# Altium footprint library 集大电协1.5.PcbLib: 227 footprints (part 11 of 18)
Each footprint in its own frame and in the unit in brackets; x right, y up, seen from the top. Pads: shape width x height; smd on the part's side, far side on the other; paste and mask are expansions set on the pad; w line width, h text height; cw(c..) or ccw(c..) is an arc to the next point about the centre after c.
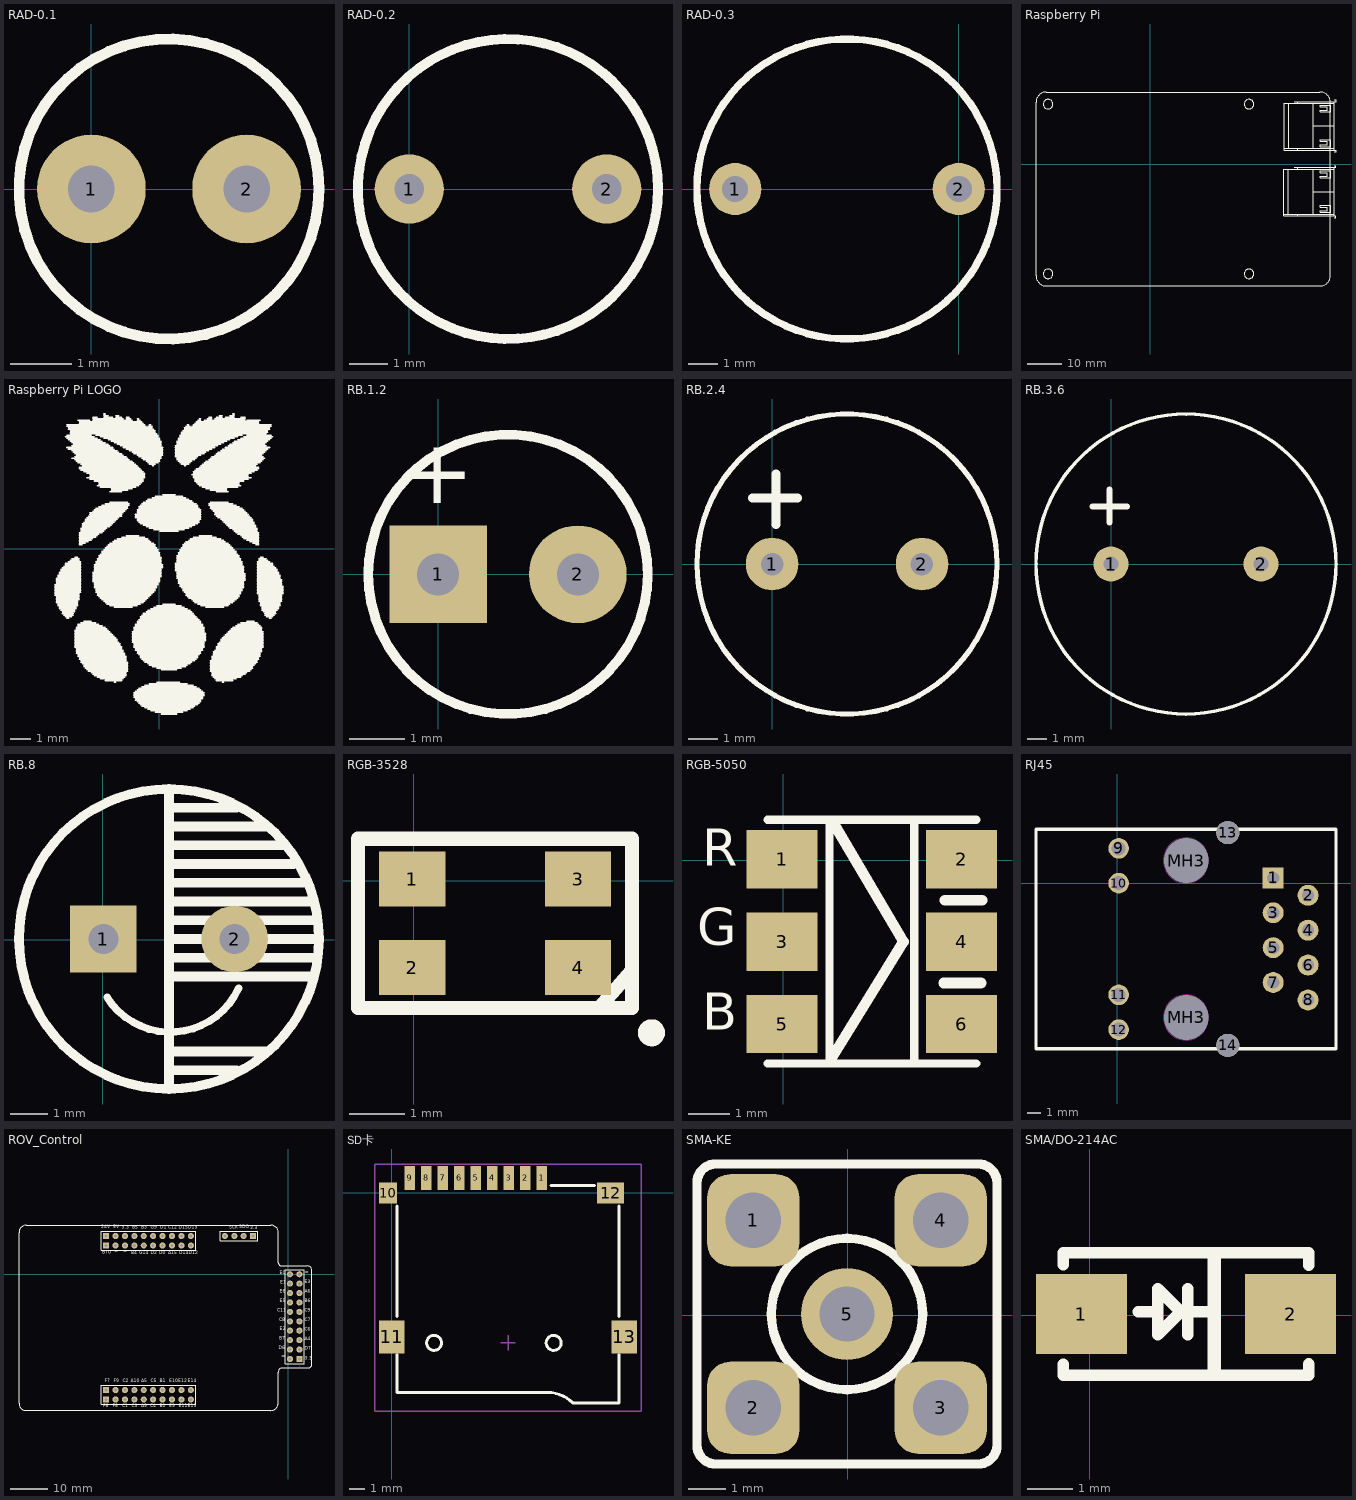
[diagram p10: the footprints below, top view; thin cyan lines are the x and y axes]

## RAD-0.1 [mil]
pads (2):
  round 70 hole 30: 1(0,0) 2(100,0)
Top Overlay:
  circle w7: c50,0 r96.65

## RAD-0.2 [mil]
pads (2):
  round 70 hole 30: 1(0,0) 2(200,0)
Top Overlay:
  circle w10: c100,0 r151.92
3D body: height 472.44, standoff -98.43, extent -96.56,-197.84 296.57,195.86

## RAD-0.3 [mil]
pads (2):
  round 70 hole 35: 1(-300,0) 2(0,0)
Top Overlay:
  circle w10: c-150,0 r201.21
3D body: height 1000, standoff -1131.89, extent -417,-243.84 102.01,275.84

## Raspberry Pi [mm]
Top Overlay:
  circle w0.254: c28.556,17.281 r1.375
  circle w0.254: c-29.444,-31.719 r1.375
  circle w0.254: c-29.444,17.281 r1.375
  circle w0.254: c28.556,-31.719 r1.375
  lines w0.1: 38.606,-14.465 42.606,-14.465 ; 38.681,4.535 42.681,4.535 ; 39.906,-14.465 39.906,-1.465 ; 39.981,4.535 39.981,17.535 ; 41.606,-0.965 53.106,-0.965 ; 41.681,18.035 53.181,18.035 ; 42.606,-14.965 42.606,-14.465 ; 42.606,-0.965 42.606,-1.465 53.106,-1.465 39.906,-1.465 ; 42.681,4.035 42.681,4.535 ; 42.681,18.035 42.681,17.535 53.181,17.535 39.981,17.535 ; 47.106,-14.465 47.106,-1.465 ; 47.106,-7.965 53.106,-7.965 53.106,-0.965 ; 47.181,4.535 47.181,17.535 ; 47.181,11.035 53.181,11.035 53.181,18.035 ; 53.106,-15.465 53.606,-15.465 53.606,-14.965 53.106,-14.965 ; 53.106,-14.465 42.606,-14.465 ; 53.106,-0.465 53.606,-0.465 53.606,-0.965 53.106,-0.965 ; 53.181,3.535 53.681,3.535 53.681,4.035 53.181,4.035 ; 53.181,4.535 42.681,4.535 ; 53.181,18.535 53.681,18.535 53.681,18.035 53.181,18.035 ; 39.906,-1.465 38.606,-1.465 38.606,-7.965 38.606,-14.965 53.106,-14.965 ; 39.981,17.535 38.681,17.535 38.681,11.035 38.681,4.035 53.181,4.035 ; 53.106,-14.965 53.106,-0.965 ; 53.181,4.035 53.181,18.035 ; 49.106,-13.965 52.106,-13.965 52.106,-13.465 52.106,-11.965 49.106,-11.965 49.106,-12.465 51.106,-12.465 51.106,-13.465 49.106,-13.465 49.106,-13.965 ; 49.106,-3.965 52.106,-3.965 52.106,-3.465 52.106,-1.965 49.106,-1.965 49.106,-2.465 51.106,-2.465 51.106,-3.465 49.106,-3.465 49.106,-3.965 ; 49.181,5.035 49.181,5.535 51.181,5.535 51.181,6.535 49.181,6.535 49.181,7.035 52.181,7.035 52.181,5.535 52.181,5.035 49.181,5.035 ; 49.181,15.035 49.181,15.535 51.181,15.535 51.181,16.535 49.181,16.535 49.181,17.035 52.181,17.035 52.181,15.535 52.181,15.035 49.181,15.035
  lines w0.254: -32.944,-32.219 ccw(c-29.944,-32.219) -29.944,-35.219 49.056,-35.219 ccw(c49.056,-32.219) 52.056,-32.219 52.056,17.781 ccw(c49.056,17.781) 49.056,20.781 -29.944,20.781 ccw(c-29.944,17.781) -32.944,17.781 -32.944,-32.219

## Raspberry Pi LOGO [mm]
Top Overlay:
  drawing of 575 lines, arcs and shapes, not listed

## RB.1.2 [mil]
pads (2):
  rect 70x70 hole 30: 1(0,0)
  round 70 hole 30: 2(100,0)
Top Overlay:
  circle w7: c50,0 r100
  text "+" at 26,36 h78.74
3D body "CAP_4X7.STEP": height 277.8, standoff -667.09, extent -27.56,-72.83 129.92,84.65

## RB.2.4 [mil]
pads (2):
  round 70 hole 30: 1(0,0) 2(200,0)
Top Overlay:
  circle w7: c100,0 r200
  lines w12: -26,88 34,88 ; 5,53 5,120
3D body "CAP 10.STEP": height 511.81, standoff -543.31, extent -109.65,-218.35 315.94,206.54

## RB.3.6 [mil]
pads (2):
  round 70 hole 30: 1(0,0) 2(300,0)
Top Overlay:
  circle w7: c150,0 r300
  lines w12: -37,115 32,115 ; -3,83 -3,149
3D body "Capacitor Radial Electrolitic.step": height 1575.2, standoff -106.3, extent -203.73,-352.35 504.23,356.3

## RB.8 [mil]
pads (2):
  rect 70x70 / inner round 70 / far side round 70 hole 31.5: 1(0.6,0.53)
  round 70 hole 31.5: 2(138.39,0.53)
Top Overlay:
  circle w10: c69.5,0.53 r157.48
  lines w7.87: 4.48,-60.81 ccw(c70.87,-18.49) 142.48,-51.23
  lines w10: 69.5,-153.02 69.5,154.07 ; 69.5,-137.27 140.44,-137.27 ; 69.5,-117.58 170.44,-117.58 ; 69.5,-38.84 220.44,-38.84 ; 69.5,-19.16 220.44,-19.16 ; 69.5,0.53 226.98,0.53 ; 69.5,20.21 220.44,20.21 ; 69.5,39.9 220.44,39.9 ; 69.5,59.58 210.44,59.58 ; 69.5,79.27 200.44,79.27 ; 69.5,98.95 190.44,98.95 ; 69.5,118.64 170.44,118.64 ; 69.5,138.32 140.44,138.32
3D body "SW3dPS-Cap electro 8x11.5x3.5mm.STEP": height 465.57, standoff -144.78, extent -88.98,-157.94 227.98,159.02

## RGB-3528 [mm]
pads (4):
  rect 1.2x1 smd: 1(-0.029,0.03) 2(-0.029,-1.57) 3(2.971,0.03) 4(2.971,-1.57)
Top Overlay:
  circle w0.254: c4.3,-2.75 r0.117
  lines w0.254: 3.375,-2.275 3.925,-1.65 ; -1.007,-2.301 3.949,-2.301 3.949,0.758 -1.007,0.758 -1.007,-2.301
3D body "User Library-KAA-3528.STEP": height 1.9, standoff 0, extent -0.325,-2.2 3.175,0.6

## RGB-5050 [mm]
pads (6):
  rect 1.7x1.397 smd: 1(-0.022,0.025) 2(4.278,0.025) 3(-0.022,-1.95) 4(4.278,-1.95) 5(-0.022,-3.925) 6(4.278,-3.925)
Top Overlay:
  lines w0.2: -0.372,-4.871 4.628,-4.871 ; -0.372,0.971 4.628,0.971 ; 1.112,-4.871 1.112,0.971 ; 3.144,-4.744 3.144,0.971
  lines w0.254: 1.182,-4.709 2.89,-1.95 1.239,0.844 ; 3.855,-2.94 4.744,-2.94 ; 3.88,-0.959 4.769,-0.959
  text "B" at -1.936,-4.363 h1.52
  text "G" at -2.063,-2.331 h1.52
  text "R" at -1.936,-0.426 h1.52
3D body: height 1.4, standoff -0.15, extent -0.622,-4.41 4.878,0.59

## RJ45 [mm]
pads (16):
  rect 1.524x1.524 hole 0.889: 1(11.347,0.398)
  round 1.524 hole 0.889: 2(13.887,-0.872) 3(11.347,-2.142) 4(13.887,-3.412) 5(11.347,-4.682) 6(13.887,-5.952) 7(11.347,-7.222) 8(13.887,-8.492)
  round 1.5 hole 1.02: 9(0.097,2.548) 10(0.097,0.012) 11(0.097,-8.116) 12(0.097,-10.652)
  round 1.7 hole 1.65: 13(8.045,3.698) 14(8.045,-11.802)
  round 2.95 hole 3.25: MH3(5.01,-9.768) MH3(5.01,1.662)
Top Overlay:
  lines w0.254: -5.925,-12.052 -5.925,-4.052 -5.925,3.948 15.919,3.948 15.919,-4.052 15.919,-12.052 -5.925,-12.052
Keep-Out Layer:
  circle w0.051: c4.997,-9.766 r1.65
  circle w0.051: c4.997,1.664 r1.65
Multi-Layer:
  circle w0.127: c5.01,1.662 r1.798
  circle w0.127: c5.01,-9.768 r1.798
3D body "RJ45 HanRun网口3D封装.STEP": height 14, standoff -2.5, extent -5.825,-12.075 15.575,3.805

## ROV_Control [mil] "航行器控制中心"
pads (64):
  rect 65x65 hole 34: 1(-1936.07,306.74) 20(-1936.07,407.13) 31(117.59,-898.86) 41(-1936.07,-1329.03) 60(-1936.07,-1228.64) 61(-374.2,408.2)
  round 65 hole 34: 2(-1836.07,306.74) 3(-1736.07,306.74) 4(-1636.07,306.74) 5(-1536.27,306.74) 6(-1436.27,306.74) 8(-1236.46,306.74) 10(-1036.07,306.74) 11(-1036.07,407.13) 13(-1236.46,407.13) 15(-1436.27,407.13) 16(-1536.27,407.13) 17(-1636.07,407.13) 18(-1736.07,407.13) 19(-1836.07,407.13) 21(17.2,1.14) 22(17.2,-98.86) 23(17.2,-198.86) 24(17.2,-298.86) 25(17.2,-398.66) 26(17.2,-498.66) 28(17.2,-698.46) 30(17.2,-898.86) 33(117.59,-698.46) 35(117.59,-498.66) 36(117.59,-398.66) 37(117.59,-298.86) 38(117.59,-198.86) 39(117.59,-98.86) 40(117.59,1.14) 42(-1836.07,-1329.03) 43(-1736.07,-1329.03) 44(-1636.07,-1329.03) 45(-1536.27,-1329.03) 46(-1436.27,-1329.03) 48(-1236.46,-1329.03) 50(-1036.07,-1329.03) 51(-1036.07,-1228.64) 53(-1236.46,-1228.64) 55(-1436.27,-1228.64) 56(-1536.27,-1228.64) 57(-1636.07,-1228.64) 58(-1736.07,-1228.64) 59(-1836.07,-1228.64) 62(-474.2,408.2) 63(-574.2,408.2) 64(-674.2,408.2)
  round 65 hole 34 paste+0: 7(-1336.46,306.74) 9(-1136.07,306.74) 12(-1136.07,407.13) 14(-1336.46,407.13) 27(17.2,-598.46) 29(17.2,-798.86) 32(117.59,-798.86) 34(117.59,-598.46) 47(-1336.46,-1329.03) 49(-1136.07,-1329.03) 52(-1136.07,-1228.64) 54(-1336.46,-1228.64)
Bottom Layer:
  region: 115.18,-967.46 115.18,-982.46
  region: 115.18,-967.46 115.18,-982.46
  region: 115.18,-967.46 115.18,-982.46
Top Overlay:
  lines w7.87: -1986.07,-1279.03 -1986.07,-1379.03 -984.5,-1379.03 -984.5,-1279.03 ; -1986.07,-1278.64 -1986.07,-1178.64 -984.5,-1178.64 -984.5,-1278.64 ; -1986.07,356.74 -1986.07,256.74 -984.5,256.74 -984.5,356.74 ; -1986.07,357.13 -1986.07,457.13 -984.5,457.13 -984.5,357.13 ; 67.2,-950.43 -32.8,-950.43 -32.8,51.14 67.2,51.14 ; 67.59,-950.43 167.59,-950.43 167.59,51.14 67.59,51.14 ; -724.2,358.2 -324.2,358.2 -324.2,458.2 -724.2,458.2 -724.2,358.2
  lines w10: -187.22,-1446.42 ccw(c-187.22,-1367.68) -108.48,-1367.68 ; -184.3,-1446.16 -2782.72,-1446.16 cw(c-2782.72,-1367.42) -2861.46,-1367.42 -2861.46,443.61 cw(c-2782.72,443.61) -2782.72,522.35 -184.3,522.35 cw(c-184.3,443.61) -105.56,443.61 -105.56,122.82 ccw(c-72.27,122.82) -72.27,89.54 202.75,89.54 cw(c202.75,41.1) 251.18,41.1 251.18,-949.15 cw(c205.87,-949.15) 205.87,-994.46 -58.82,-994.46 ; -108.48,-1366.69 -108.48,-1040.48 ; -108.48,-1041.46 cw(c-61.74,-1041.46) -61.74,-994.72
  text "G9" at -1463,468.89 h60
  text "G14" at -1585,197.54 h60
  text "3.3" at -1767.82,468.33 h60
  text "3.3" at 173.18,-920.46 h60
  text "-" at 175.72,-39.47 h150
  text "E2" at -90.72,-610.98 h60
  text "B7" at -96.6,-711.97 h60
  text "E0" at -91.83,-13.47 h60
  text "E1" at -84.78,-113.01 h60
  text "E3" at 175.58,-112.85 h60
  text "A6" at 175.63,-213.3 h60
  text "E6" at -91.83,-211.45 h60
  text "E5" at -90.72,-313.44 h60
  text "B6" at 175.58,-313.75 h60
  text "C11" at -117.82,-411.46 h60
  text "C9" at 175.63,-414.21 h60
  text "C8" at -98.49,-513.43 h60
  text "C7" at 175.63,-514.66 h60
  text "C6" at 175.63,-615.11 h60
  text "A4" at 175.63,-716.12 h60
  text "D7" at 175.58,-816.57 h60
  text "E14" at -1070.82,-1162.46 h60
  text "E12" at -1168.82,-1162.46 h60
  text "E10" at -1266.82,-1162.46 h60
  text "B1" at -1364.82,-1162.46 h60
  text "A5" at -1560.76,-1161.69 h60
  text "A10" at -1671.82,-1163.46 h60
  text "F9" at -1854.82,-1162.3 h60
  text "F7" at -1952.82,-1161.69 h60
  text "C2" at -1756.76,-1162.3 h60
  text "C5" at -1462.76,-1162.3 h60
  text "A15" at -1275,197.54 h60
  text "D14" at -1159.82,196.98 h60
  text "D12" at -1057.82,196.98 h60
  text "D13" at -1062.82,468.89 h60
  text "D15" at -1164.82,468.89 h60
  text "C12" at -1277,468.89 h60
  text "D1" at -1359,468.33 h60
  text "D0" at -1370,197 h60
  text "D2" at -1463,197 h60
  text "B4" at -1669.82,196.98 h60
  text "B3" at -1560.32,468.89 h60
  text "B5" at -1659.82,468.89 h60
  text "-" at -1755.91,180.47 h150
  text "-" at -1851.82,180.47 h150
  text "BT0" at -1976.82,202.54 h60
  text "5V" at -1858.82,473.89 h60
  text "24V" at -1986.22,473.33 h60
  text "C4" at -1465.43,-1425.3 h60
  text "C3" at -1664.76,-1425.3 h60
  text "C1" at -1764.43,-1425.46 h60
  text "E13" at -1066.82,-1425.46 h60
  text "E11" at -1166.49,-1425.46 h60
  text "E9" at -1266.15,-1425.3 h60
  text "B0" at -1365.82,-1425.3 h60
  text "A9" at -1565.1,-1425.46 h60
  text "F8" at -1864.15,-1425.3 h60
  text "F6" at -1963.82,-1425.3 h60
  text "SDO" at -521.82,471.52 h60
  text "SCK" at -629.82,470.52 h60
  text "3.3" at -406.82,465.52 h60
  text "-" at -693.82,454.52 h150
  text "-" at -76.1,-931.46 h150
  text "D6" at -101.76,-812.41 h60
3D body "Samtec-SSW-101-01-F-D.step": height 335, standoff -104, extent -31.73,-60.71 163.27,59.29
3D body "Samtec-SSW-101-01-F-D.step": height 335, standoff -104, extent -31.73,-160.71 163.27,-40.71
3D body "Samtec-SSW-101-01-F-D.step": height 335, standoff -104, extent -31.73,-260.71 163.27,-140.71
3D body "Samtec-SSW-101-01-F-D.step": height 335, standoff -104, extent -31.73,-360.71 163.27,-240.71
3D body "Samtec-SSW-101-01-F-D.step": height 335, standoff -104, extent -31.73,-460.71 163.27,-340.71
3D body "Samtec-SSW-101-01-F-D.step": height 335, standoff -104, extent -31.73,-560.71 163.27,-440.71
3D body "Samtec-SSW-101-01-F-D.step": height 335, standoff -104, extent -31.73,-660.71 163.27,-540.71
3D body "Samtec-SSW-101-01-F-D.step": height 335, standoff -104, extent -31.73,-760.71 163.27,-640.71
3D body "Samtec-SSW-101-01-F-D.step": height 335, standoff -104, extent -31.73,-860.71 163.27,-740.71
3D body "Samtec-SSW-101-01-F-D.step": height 335, standoff -104, extent -31.73,-960.71 163.27,-840.71
3D body "Samtec-SSW-101-01-F-D.step": height 335, standoff -104, extent -1095.16,257.01 -975.16,452.01
3D body "Samtec-SSW-101-01-F-D.step": height 335, standoff -104, extent -1195.16,257.01 -1075.16,452.01
3D body "Samtec-SSW-101-01-F-D.step": height 335, standoff -104, extent -1295.16,257.01 -1175.16,452.01
3D body "Samtec-SSW-101-01-F-D.step": height 335, standoff -104, extent -1395.16,257.01 -1275.16,452.01
3D body "Samtec-SSW-101-01-F-D.step": height 335, standoff -104, extent -1495.16,257.01 -1375.16,452.01
3D body "Samtec-SSW-101-01-F-D.step": height 335, standoff -104, extent -1595.16,257.01 -1475.16,452.01
3D body "Samtec-SSW-101-01-F-D.step": height 335, standoff -104, extent -1695.16,257.01 -1575.16,452.01
3D body "Samtec-SSW-101-01-F-D.step": height 335, standoff -104, extent -1795.16,257.01 -1675.16,452.01
3D body "Samtec-SSW-101-01-F-D.step": height 335, standoff -104, extent -1895.16,257.01 -1775.16,452.01
3D body "Samtec-SSW-101-01-F-D.step": height 335, standoff -104, extent -1995.16,257.01 -1875.16,452.01
3D body "Samtec-SSW-101-01-F-D.step": height 335, standoff -104, extent -1094.18,-1376.85 -974.18,-1181.85
3D body "Samtec-SSW-101-01-F-D.step": height 335, standoff -104, extent -1194.18,-1376.85 -1074.18,-1181.85
3D body "Samtec-SSW-101-01-F-D.step": height 335, standoff -104, extent -1294.18,-1376.85 -1174.18,-1181.85
3D body "Samtec-SSW-101-01-F-D.step": height 335, standoff -104, extent -1394.18,-1376.85 -1274.18,-1181.85
3D body "Samtec-SSW-101-01-F-D.step": height 335, standoff -104, extent -1494.18,-1376.85 -1374.18,-1181.85
3D body "Samtec-SSW-101-01-F-D.step": height 335, standoff -104, extent -1594.18,-1376.85 -1474.18,-1181.85
3D body "Samtec-SSW-101-01-F-D.step": height 335, standoff -104, extent -1694.18,-1376.85 -1574.18,-1181.85
3D body "Samtec-SSW-101-01-F-D.step": height 335, standoff -104, extent -1794.18,-1376.85 -1674.18,-1181.85
3D body "Samtec-SSW-101-01-F-D.step": height 335, standoff -104, extent -1894.18,-1376.85 -1774.18,-1181.85
3D body "Samtec-SSW-101-01-F-D.step": height 335, standoff -104, extent -1994.18,-1376.85 -1874.18,-1181.85
3D body "HDR2.54-1P_M.STEP": height 334.65, standoff -118.11, extent -524.6,356.49 -424.6,456.49
3D body "HDR2.54-1P_M.STEP": height 334.65, standoff -118.11, extent -424.6,356.49 -324.6,456.49
3D body "HDR2.54-1P_M.STEP": height 334.65, standoff -118.11, extent -724.6,356.49 -624.6,456.49
3D body "HDR2.54-1P_M.STEP": height 334.65, standoff -118.11, extent -624.6,356.49 -524.6,456.49

## SD卡 [mm]
pads (13):
  rect 0.7x1.6 smd: 1(10.022,1) 2(8.922,1) 3(7.822,1) 4(6.722,1) 5(5.622,1) 6(4.522,1) 7(3.422,1) 8(2.322,1) 9(1.222,1)
  rect 1.2x1.4 smd: 10(-0.232,-0.008)
  rect 1.7x2.2 smd: 11(0.022,-9.608) 13(15.522,-9.608)
  rect 1.8x1.4 smd: 12(14.622,-0.008)
Top Overlay:
  circle w0.2: c2.842,-10.008 r0.5
  circle w0.2: c10.822,-10.008 r0.5
  lines w0.2: 0.372,-10.77 0.372,-13.308 8.788,-13.308 ; 0.372,-8.23 0.372,-0.864 ; 8.534,-13.308 10.4,-13.308 cw(c10.4,-15.698) 12.09,-14.008 15.172,-14.008 15.172,-10.77 ; 10.652,0.492 13.528,0.492 ; 15.172,-8.23 15.172,-0.864
Mechanical 15:
  lines w0.1: 7.272,-10.008 8.272,-10.008 ; 7.772,-10.508 7.772,-9.508 ; -1.118,-14.58 16.662,-14.58 16.662,1.93 -1.118,1.93 -1.118,-14.58
3D body "tf_card_1.stp": height 2.15, standoff -0.3, extent -0.277,-16.27 15.823,1.029

## SMA-KE [mm] "天线接头"
pads (5):
  rrect50% 2.5x2.5 hole 1.5: 1(-2.557,2.57) 2(-2.557,-2.51) 3(2.523,-2.51) 4(2.523,2.57)
  round 2.5 hole 1.5: 5(-0.017,0.03)
Top Overlay:
  circle w0.254: c-0.017,0.03 r2.048
  lines w0.2: 4.047,-3.526 4.047,-3.526 ; 4.047,-3.526 4.047,-3.526
  lines w0.254: 3.539,4.094 cw(c3.539,3.586) 4.047,3.586 4.047,-3.526 cw(c3.539,-3.526) 3.539,-4.034 -3.573,-4.034 cw(c-3.573,-3.526) -4.081,-3.526 -4.081,3.586 cw(c-3.573,3.586) -3.573,4.094 3.539,4.094 ; 3.539,4.094 3.539,4.094
3D body "User Library-SMA_Stehend_Amp 132134RP-1.STEP": height 9.53, standoff -3.94, extent -3.517,-3.47 3.483,3.53

## SMA/DO-214AC [mm]
pads (2):
  rect 2x1.75 smd: 1(-0.178,0.025) 2(4.422,0.025)
Top Overlay:
  lines w0.254: -0.578,-1.08 -0.578,-1.325 4.822,-1.325 4.822,-1.075 ; -0.578,1.105 -0.578,1.375 4.817,1.375 ; 1.067,0.076 1.397,0.076 ; 2.159,-0.432 2.159,0.584 ; 2.159,0.076 2.667,0.076 ; 4.822,1.1 4.822,1.375 ; 1.499,-0.432 2.007,0.076 1.499,0.584 1.499,-0.432
  lines w0.3: 2.742,-1.275 2.742,1.325
3D body "User Library-S1G.STEP": height 2.12, standoff -0.02, extent -0.376,-1.317 4.73,1.35